# Altium integrated library LEMO Unipole And Multipole Type Connectors.IntLib: 1566 symbols (part 6 of 13) (continued)
## EXG.1B.308.HLN
designator J?
Elbow receptacle for printed circuit with two nuts (solder or screw fixing, back panel mounting), Key (G), 1B series, Multipole Type with 8 Contacts; Manufacturer: LEMO; PartNumber: EXG.1B.308.HLN; Number of contacts: 8; Contact Diameter: 0.7 mm; AWG: 24; Rated Current(A): 2; DatasheetVersion: Jun-14; PackageReference: EXG.1B.308.HLN; PackageDescription: Elbow receptacle for printed circuit with two nuts (solder or screw fixing, back panel mounting), Key(G) for Printed Circuit; Supplier 1: Mouser; Supplier Part Number 1: 736-EXG1B308HLN; Supplier 2: Digi-Key; Supplier Part Number 2: 1124-1373-ND; ComponentLink1Description: Manufacturer URL; ComponentLink1URL: http://www.lemo.com; ComponentLink2Description: Datasheet; ComponentLink2URL: http://intra.lemo.ch/catalog/ROW/UK_English/unipole_multipole.pdf
footprint EXG.1B.308.HLN (Socket, Female, Body 11mm dia. Height 14 mm, Through hole)
pins: 1, 2, 3, 4, 5, 6, 7, 8, 10, 11, 12, 13

## EXG.1B.308.HLNS
designator J?
Elbow receptacle for printed circuit with two nuts (solder or screw fixing, back panel mounting), Key (G), 1B series, Multipole Type with 8 Contacts; Manufacturer: LEMO; PartNumber: EXG.1B.308.HLNS; Number of contacts: 8; Contact Diameter: 0.7 mm; AWG: 24; Rated Current(A): 2; DatasheetVersion: Jun-14; PackageReference: EXG.1B.308.HLNS; PackageDescription: Elbow receptacle for printed circuit with two nuts (solder or screw fixing, back panel mounting), Key(G) for Printed Circuit; Supplier 1: Mouser; Supplier Part Number 1: 736-EXG1B308HLNS; Supplier 2: Digi-Key; Supplier Part Number 2: EXG.1B.308.HLNS-ND; ComponentLink1Description: Manufacturer URL; ComponentLink1URL: http://www.lemo.com; ComponentLink2Description: Datasheet; ComponentLink2URL: http://intra.lemo.ch/catalog/ROW/UK_English/unipole_multipole.pdf
footprint EXG.1B.308.HLNS (Socket, Female, Body 11mm dia. Height 14 mm, Through hole)
pins: 1, 2, 3, 4, 5, 6, 7, 8, 10, 11, 12, 13

## EXG.1B.310.HLN
designator J?
Elbow receptacle for printed circuit with two nuts (solder or screw fixing, back panel mounting), Key (G), 1B series, Multipole Type with 10 Contacts; Manufacturer: LEMO; PartNumber: EXG.1B.310.HLN; Number of contacts: 10; Contact Diameter: 0.5 mm; AWG: 28; Rated Current(A): 1.5.; DatasheetVersion: Jun-14; PackageReference: EXG.1B.310.HLN; PackageDescription: Elbow receptacle for printed circuit with two nuts (solder or screw fixing, back panel mounting), Key(G) for Printed Circuit; Supplier 1: Mouser; Supplier Part Number 1: 736-EXG1B310HLN; Supplier 2: Digi-Key; Supplier Part Number 2: EXG.1B.310.HLN-ND; ComponentLink1Description: Manufacturer URL; ComponentLink1URL: http://www.lemo.com; ComponentLink2Description: Datasheet; ComponentLink2URL: http://intra.lemo.ch/catalog/ROW/UK_English/unipole_multipole.pdf
footprint EXG.1B.310.HLN (Socket, Female, Body 11mm dia. Height 14 mm, Through hole)
pins: 1, 2, 3, 4, 5, 6, 7, 8, 9, 10, 12, 13, 14, 15

## EXG.1B.310.HLNS
designator J?
Elbow receptacle for printed circuit with two nuts (solder or screw fixing, back panel mounting), Key (G), 1B series, Multipole Type with 10 Contacts; Manufacturer: LEMO; PartNumber: EXG.1B.310.HLNS; Number of contacts: 10; Contact Diameter: 0.5 mm; AWG: 28; Rated Current(A): 1.5.; DatasheetVersion: Jun-14; PackageReference: EXG.1B.310.HLNS; PackageDescription: Elbow receptacle for printed circuit with two nuts (solder or screw fixing, back panel mounting), Key(G) for Printed Circuit; Supplier 1: Mouser; Supplier Part Number 1: 736-EXG1B310HLNS; Supplier 2: Digi-Key; Supplier Part Number 2: EXG.1B.310.HLNS-ND; ComponentLink1Description: Manufacturer URL; ComponentLink1URL: http://www.lemo.com; ComponentLink2Description: Datasheet; ComponentLink2URL: http://intra.lemo.ch/catalog/ROW/UK_English/unipole_multipole.pdf
footprint EXG.1B.310.HLNS (Socket, Female, Body 11mm dia. Height 14 mm, Through hole)
pins: 1, 2, 3, 4, 5, 6, 7, 8, 9, 10, 12, 13, 14, 15

## EYA.0B.307.CLN
designator J?
Fixed receptacle for printed circuit, nut fixing (back panel mounting), Key (A), 0B series, Multipole Type with 7 Contacts; Manufacturer: LEMO; PartNumber: EYA.0B.307.CLN; Number of contacts: 7; Contact Diameter: 0.5 mm; AWG: 28; Rated Current(A): 2.5; DatasheetVersion: Jun-14; PackageReference: EYA.0B.307.CLN; PackageDescription: Fixed receptacle for printed circuit, nut fixing (back panel mounting), Key(A) for Printed Circuit; Supplier 1: Mouser; Supplier Part Number 1: 736-EYA.0B.307.CLN; Supplier 2: Digi-Key; Supplier Part Number 2: EYA.0B.307.CLN-ND; ComponentLink1Description: Manufacturer URL; ComponentLink1URL: http://www.lemo.com; ComponentLink2Description: Datasheet; ComponentLink2URL: http://intra.lemo.ch/catalog/ROW/UK_English/unipole_multipole.pdf
footprint EYA.0B.307.CLN (Socket, Female, Body 9mm dia. Height 15 mm, Through hole)
pins: 1, 2, 3, 4, 5, 6, 7, 9, 10, 11, 12

## EYA.0B.309.CLN
designator J?
Fixed receptacle for printed circuit, nut fixing (back panel mounting), Key (A), 0B series, Multipole Type with 9 Contacts; Manufacturer: LEMO; PartNumber: EYA.0B.309.CLN; Number of contacts: 9; Contact Diameter: 0.5 mm; AWG: 28; Rated Current(A): 2; DatasheetVersion: Jun-14; PackageReference: EYA.0B.309.CLN; PackageDescription: Fixed receptacle for printed circuit, nut fixing (back panel mounting), Key(A) for Printed Circuit; ComponentLink1Description: Manufacturer URL; ComponentLink1URL: http://www.lemo.com; ComponentLink2Description: Datasheet; ComponentLink2URL: http://intra.lemo.ch/catalog/ROW/UK_English/unipole_multipole.pdf
footprint EYA.0B.309.CLN (Socket, Female, Body 9mm dia. Height 15 mm, Through hole)
pins: 1, 2, 3, 4, 5, 6, 7, 8, 9, 11, 12, 13, 14

## EYB.0B.305.CLN
designator J?
Fixed receptacle for printed circuit, nut fixing (back panel mounting), Key (B), 0B series, Multipole Type with 5 Contacts; Manufacturer: LEMO; PartNumber: EYB.0B.305.CLN; Number of contacts: 5; Contact Diameter: 0.7 mm; AWG: 24; Rated Current(A): 6.5; DatasheetVersion: Jun-14; PackageReference: EYB.0B.305.CLN; PackageDescription: Fixed receptacle for printed circuit, nut fixing (back panel mounting), Key(B) for Printed Circuit; ComponentLink1Description: Manufacturer URL; ComponentLink1URL: http://www.lemo.com; ComponentLink2Description: Datasheet; ComponentLink2URL: http://intra.lemo.ch/catalog/ROW/UK_English/unipole_multipole.pdf
footprint EYB.0B.305.CLN (Socket, Female, Body 9mm dia. Height 15 mm, Through hole)
pins: 1, 2, 3, 4, 5, 7, 8, 9, 10

## EYB.0B.309.CLN
designator J?
Fixed receptacle for printed circuit, nut fixing (back panel mounting), Key (B), 0B series, Multipole Type with 9 Contacts; Manufacturer: LEMO; PartNumber: EYB.0B.309.CLN; Number of contacts: 9; Contact Diameter: 0.5 mm; AWG: 28; Rated Current(A): 2; DatasheetVersion: Jun-14; PackageReference: EYB.0B.309.CLN; PackageDescription: Fixed receptacle for printed circuit, nut fixing (back panel mounting), Key(B) for Printed Circuit; ComponentLink1Description: Manufacturer URL; ComponentLink1URL: http://www.lemo.com; ComponentLink2Description: Datasheet; ComponentLink2URL: http://intra.lemo.ch/catalog/ROW/UK_English/unipole_multipole.pdf
footprint EYB.0B.309.CLN (Socket, Female, Body 9mm dia. Height 15 mm, Through hole)
pins: 1, 2, 3, 4, 5, 6, 7, 8, 9, 11, 12, 13, 14

## EYG.0B.302.CLN
designator J?
Fixed receptacle for printed circuit, nut fixing (back panel mounting), Key (G), 0B series, Multipole Type with 2 Contacts; Manufacturer: LEMO; PartNumber: EYG.0B.302.CLN; Number of contacts: 2; Contact Diameter: 0.9 mm; AWG: 22; Rated Current(A): 10; DatasheetVersion: Jun-14; PackageReference: EYG.0B.302.CLN; PackageDescription: Fixed receptacle for printed circuit, nut fixing (back panel mounting), Key(G) for Printed Circuit; Supplier 1: Mouser; Supplier Part Number 1: 736-EYG0B302CLN; Supplier 2: Digi-Key; Supplier Part Number 2: EYG.0B.302.CLN-ND; ComponentLink1Description: Manufacturer URL; ComponentLink1URL: http://www.lemo.com; ComponentLink2Description: Datasheet; ComponentLink2URL: http://intra.lemo.ch/catalog/ROW/UK_English/unipole_multipole.pdf
footprint EYG.0B.302.CLN (Socket, Female, Body 9mm dia. Height 15 mm, Through hole)
pins: 1, 2, 4, 5, 6, 7

## EYG.0B.303.CLN
designator J?
Fixed receptacle for printed circuit, nut fixing (back panel mounting), Key (G), 0B series, Multipole Type with 3 Contacts; Manufacturer: LEMO; PartNumber: EYG.0B.303.CLN; Number of contacts: 3; Contact Diameter: 0.9 mm; AWG: 22; Rated Current(A): 8; DatasheetVersion: Jun-14; PackageReference: EYG.0B.303.CLN; PackageDescription: Fixed receptacle for printed circuit, nut fixing (back panel mounting), Key(G) for Printed Circuit; Supplier 1: Mouser; Supplier Part Number 1: 736-EYG0B303CLN; Supplier 2: Digi-Key; Supplier Part Number 2: EYG.0B.303.CLN-ND; ComponentLink1Description: Manufacturer URL; ComponentLink1URL: http://www.lemo.com; ComponentLink2Description: Datasheet; ComponentLink2URL: http://intra.lemo.ch/catalog/ROW/UK_English/unipole_multipole.pdf
footprint EYG.0B.303.CLN (Socket, Female, Body 9mm dia. Height 15 mm, Through hole)
pins: 1, 2, 3, 5, 6, 7, 8

## EYG.0B.304.CLN
designator J?
Fixed receptacle for printed circuit, nut fixing (back panel mounting), Key (G), 0B series, Multipole Type with 4 Contacts; Manufacturer: LEMO; PartNumber: EYG.0B.304.CLN; Number of contacts: 4; Contact Diameter: 0.7 mm; AWG: 24; Rated Current(A): 7; DatasheetVersion: Jun-14; PackageReference: EYG.0B.304.CLN; PackageDescription: Fixed receptacle for printed circuit, nut fixing (back panel mounting), Key(G) for Printed Circuit; Supplier 1: Mouser; Supplier Part Number 1: 736-EYG0B304CLN; Supplier 2: Digi-Key; Supplier Part Number 2: EYG.0B.304.CLN-ND; ComponentLink1Description: Manufacturer URL; ComponentLink1URL: http://www.lemo.com; ComponentLink2Description: Datasheet; ComponentLink2URL: http://intra.lemo.ch/catalog/ROW/UK_English/unipole_multipole.pdf
footprint EYG.0B.304.CLN (Socket, Female, Body 9mm dia. Height 15 mm, Through hole)
pins: 1, 2, 3, 4, 6, 7, 8, 9

## EYG.0B.305.CLN
designator J?
Fixed receptacle for printed circuit, nut fixing (back panel mounting), Key (G), 0B series, Multipole Type with 5 Contacts; Manufacturer: LEMO; PartNumber: EYG.0B.305.CLN; Number of contacts: 5; Contact Diameter: 0.7 mm; AWG: 24; Rated Current(A): 6.5; DatasheetVersion: Jun-14; PackageReference: EYG.0B.305.CLN; PackageDescription: Fixed receptacle for printed circuit, nut fixing (back panel mounting), Key(G) for Printed Circuit; Supplier 1: Mouser; Supplier Part Number 1: 736-EYG0B305CLN; Supplier 2: Digi-Key; Supplier Part Number 2: EYG.0B.305.CLN-ND; ComponentLink1Description: Manufacturer URL; ComponentLink1URL: http://www.lemo.com; ComponentLink2Description: Datasheet; ComponentLink2URL: http://intra.lemo.ch/catalog/ROW/UK_English/unipole_multipole.pdf
footprint EYG.0B.305.CLN (Socket, Female, Body 9mm dia. Height 15 mm, Through hole)
pins: 1, 2, 3, 4, 5, 7, 8, 9, 10

## EYG.0B.306.CLN
designator J?
Fixed receptacle for printed circuit, nut fixing (back panel mounting), Key (G), 0B series, Multipole Type with 6 Contacts; Manufacturer: LEMO; PartNumber: EYG.0B.306.CLN; Number of contacts: 6; Contact Diameter: 0.5 mm; AWG: 28; Rated Current(A): 2.5; DatasheetVersion: Jun-14; PackageReference: EYG.0B.306.CLN; PackageDescription: Fixed receptacle for printed circuit, nut fixing (back panel mounting), Key(G) for Printed Circuit; Supplier 1: Mouser; Supplier Part Number 1: 736-EYG0B306CLN; Supplier 2: Digi-Key; Supplier Part Number 2: EYG.0B.306.CLN-ND; ComponentLink1Description: Manufacturer URL; ComponentLink1URL: http://www.lemo.com; ComponentLink2Description: Datasheet; ComponentLink2URL: http://intra.lemo.ch/catalog/ROW/UK_English/unipole_multipole.pdf
footprint EYG.0B.306.CLN (Socket, Female, Body 9mm dia. Height 15 mm, Through hole)
pins: 1, 2, 3, 4, 5, 6, 8, 9, 10, 11

## EYG.0B.307.CLN
designator J?
Fixed receptacle for printed circuit, nut fixing (back panel mounting), Key (G), 0B series, Multipole Type with 7 Contacts; Manufacturer: LEMO; PartNumber: EYG.0B.307.CLN; Number of contacts: 7; Contact Diameter: 0.5 mm; AWG: 28; Rated Current(A): 2.5; DatasheetVersion: Jun-14; PackageReference: EYG.0B.307.CLN; PackageDescription: Fixed receptacle for printed circuit, nut fixing (back panel mounting), Key(G) for Printed Circuit; Supplier 1: Mouser; Supplier Part Number 1: 736-EYG0B307CLN; Supplier 2: Digi-Key; Supplier Part Number 2: EYG.0B.307.CLN-ND; ComponentLink1Description: Manufacturer URL; ComponentLink1URL: http://www.lemo.com; ComponentLink2Description: Datasheet; ComponentLink2URL: http://intra.lemo.ch/catalog/ROW/UK_English/unipole_multipole.pdf
footprint EYG.0B.307.CLN (Socket, Female, Body 9mm dia. Height 15 mm, Through hole)
pins: 1, 2, 3, 4, 5, 6, 7, 9, 10, 11, 12

## EYG.0B.309.CLN
designator J?
Fixed receptacle for printed circuit, nut fixing (back panel mounting), Key (G), 0B series, Multipole Type with 9 Contacts; Manufacturer: LEMO; PartNumber: EYG.0B.309.CLN; Number of contacts: 9; Contact Diameter: 0.5 mm; AWG: 28; Rated Current(A): 2; DatasheetVersion: Jun-14; PackageReference: EYG.0B.309.CLN; PackageDescription: Fixed receptacle for printed circuit, nut fixing (back panel mounting), Key(G) for Printed Circuit; Supplier 1: Mouser; Supplier Part Number 1: 736-EYG0B309CLN; Supplier 2: Digi-Key; Supplier Part Number 2: EYG.0B.309.CLN-ND; ComponentLink1Description: Manufacturer URL; ComponentLink1URL: http://www.lemo.com; ComponentLink2Description: Datasheet; ComponentLink2URL: http://intra.lemo.ch/catalog/ROW/UK_English/unipole_multipole.pdf
footprint EYG.0B.309.CLN (Socket, Female, Body 9mm dia. Height 15 mm, Through hole)
pins: 1, 2, 3, 4, 5, 6, 7, 8, 9, 11, 12, 13, 14

## EZA.0B.302.CLN
designator J?
Straight receptacle for printed circuit, Key (A), 0B series, Multipole Type with 2 Contacts; Manufacturer: LEMO; PartNumber: EZA.0B.302.CLN; Number of contacts: 2; Contact Diameter: 0.9 mm; AWG: 22; Rated Current(A): 10; DatasheetVersion: Jun-14; PackageReference: EZA.0B.302.CLN; PackageDescription: Straight receptacle for printed circuit, Key(A) for Printed Circuit; Supplier 1: Mouser; Supplier Part Number 1: N/A; ComponentLink1Description: Manufacturer URL; ComponentLink1URL: http://www.lemo.com; ComponentLink2Description: Datasheet; ComponentLink2URL: http://intra.lemo.ch/catalog/ROW/UK_English/unipole_multipole.pdf
footprint EZA.0B.302.CLN (Socket, Female, Height 15 mm, Through hole)
pins: 1, 2, 4, 5, 6, 7

## EZA.0B.303.CLN
designator J?
Straight receptacle for printed circuit, Key (A), 0B series, Multipole Type with 3 Contacts; Manufacturer: LEMO; PartNumber: EZA.0B.303.CLN; Number of contacts: 3; Contact Diameter: 0.9 mm; AWG: 22; Rated Current(A): 8; DatasheetVersion: Jun-14; PackageReference: EZA.0B.303.CLN; PackageDescription: Straight receptacle for printed circuit, Key(A) for Printed Circuit; ComponentLink1Description: Manufacturer URL; ComponentLink1URL: http://www.lemo.com; ComponentLink2Description: Datasheet; ComponentLink2URL: http://intra.lemo.ch/catalog/ROW/UK_English/unipole_multipole.pdf
footprint EZA.0B.303.CLN (Socket, Female, Height 15 mm, Through hole)
pins: 1, 2, 3, 5, 6, 7, 8

## EZA.0B.309.CLN
designator J?
Straight receptacle for printed circuit, Key (A), 0B series, Multipole Type with 9 Contacts; Manufacturer: LEMO; PartNumber: EZA.0B.309.CLN; Number of contacts: 9; Contact Diameter: 0.5 mm; AWG: 28; Rated Current(A): 2; DatasheetVersion: Jun-14; PackageReference: EZA.0B.309.CLN; PackageDescription: Straight receptacle for printed circuit, Key(A) for Printed Circuit; ComponentLink1Description: Manufacturer URL; ComponentLink1URL: http://www.lemo.com; ComponentLink2Description: Datasheet; ComponentLink2URL: http://intra.lemo.ch/catalog/ROW/UK_English/unipole_multipole.pdf
footprint EZA.0B.309.CLN (Socket, Female, Height 15 mm, Through hole)
pins: 1, 2, 3, 4, 5, 6, 7, 8, 9, 11, 12, 13, 14

## EZB.0B.303.CLN
designator J?
Straight receptacle for printed circuit, Key (B), 0B series, Multipole Type with 3 Contacts; Manufacturer: LEMO; PartNumber: EZB.0B.303.CLN; Number of contacts: 3; Contact Diameter: 0.9 mm; AWG: 22; Rated Current(A): 8; DatasheetVersion: Jun-14; PackageReference: EZB.0B.303.CLN; PackageDescription: Straight receptacle for printed circuit, Key(B) for Printed Circuit; ComponentLink1Description: Manufacturer URL; ComponentLink1URL: http://www.lemo.com; ComponentLink2Description: Datasheet; ComponentLink2URL: http://intra.lemo.ch/catalog/ROW/UK_English/unipole_multipole.pdf
footprint EZB.0B.303.CLN (Socket, Female, Height 15 mm, Through hole)
pins: 1, 2, 3, 5, 6, 7, 8

## EZB.0B.305.CLN
designator J?
Straight receptacle for printed circuit, Key (B), 0B series, Multipole Type with 5 Contacts; Manufacturer: LEMO; PartNumber: EZB.0B.305.CLN; Number of contacts: 5; Contact Diameter: 0.7 mm; AWG: 24; Rated Current(A): 6.5; DatasheetVersion: Jun-14; PackageReference: EZB.0B.305.CLN; PackageDescription: Straight receptacle for printed circuit, Key(B) for Printed Circuit; Supplier 1: Mouser; Supplier Part Number 1: 736-EZB0B305CLN; Supplier 2: Digi-Key; Supplier Part Number 2: EZB.0B.305.CLN-ND; ComponentLink1Description: Manufacturer URL; ComponentLink1URL: http://www.lemo.com; ComponentLink2Description: Datasheet; ComponentLink2URL: http://intra.lemo.ch/catalog/ROW/UK_English/unipole_multipole.pdf
footprint EZB.0B.305.CLN (Socket, Female, Height 15 mm, Through hole)
pins: 1, 2, 3, 4, 5, 7, 8, 9, 10

## EZB.0B.307.CLN
designator J?
Straight receptacle for printed circuit, Key (B), 0B series, Multipole Type with 7 Contacts; Manufacturer: LEMO; PartNumber: EZB.0B.307.CLN; Number of contacts: 7; Contact Diameter: 0.5 mm; AWG: 28; Rated Current(A): 2.5; DatasheetVersion: Jun-14; PackageReference: EZB.0B.307.CLN; PackageDescription: Straight receptacle for printed circuit, Key(B) for Printed Circuit; ComponentLink1Description: Manufacturer URL; ComponentLink1URL: http://www.lemo.com; ComponentLink2Description: Datasheet; ComponentLink2URL: http://intra.lemo.ch/catalog/ROW/UK_English/unipole_multipole.pdf
footprint EZB.0B.307.CLN (Socket, Female, Height 15 mm, Through hole)
pins: 1, 2, 3, 4, 5, 6, 7, 9, 10, 11, 12

## EZF.0B.304.CLN
designator J?
Straight receptacle for printed circuit, Key (F), 0B series, Multipole Type with 4 Contacts; Manufacturer: LEMO; PartNumber: EZF.0B.304.CLN; Number of contacts: 4; Contact Diameter: 0.7 mm; AWG: 24; Rated Current(A): 7; DatasheetVersion: Jun-14; PackageReference: EZF.0B.304.CLN; PackageDescription: Straight receptacle for printed circuit, Key(F) for Printed Circuit; Supplier 1: Mouser; Supplier Part Number 1: 736-EZF0B304CLN; Supplier 2: Digi-Key; Supplier Part Number 2: EZF.0B.304.CLN-ND; ComponentLink1Description: Manufacturer URL; ComponentLink1URL: http://www.lemo.com; ComponentLink2Description: Datasheet; ComponentLink2URL: http://intra.lemo.ch/catalog/ROW/UK_English/unipole_multipole.pdf
footprint EZF.0B.304.CLN (Socket, Female, Height 15 mm, Through hole)
pins: 1, 2, 3, 4, 6, 7, 8, 9

## EZG.00.302.NLN
designator J?
Straight receptacle for printed circuit, Key (G), 00 series, Multipole Type with 2 Contacts; Manufacturer: LEMO; PartNumber: EZG.00.302.NLN; Number of contacts: 2; Contact Diameter: 0.5 mm; AWG: 28; Rated Current(A): 5; DatasheetVersion: Jun-14; PackageReference: EZG.00.302.NLN; PackageDescription: Straight receptacle for printed circuit, Key(G) for Printed Circuit; Supplier 1: Mouser; Supplier Part Number 1: 736-EZG00302NLN; Supplier 2: Digi-Key; Supplier Part Number 2: EZG.00.302.NLN-ND; ComponentLink1Description: Manufacturer URL; ComponentLink1URL: http://www.lemo.com; ComponentLink2Description: Datasheet; ComponentLink2URL: http://intra.lemo.ch/catalog/ROW/UK_English/unipole_multipole.pdf
footprint EZG.00.302.NLN (Socket, Female, Height 14 mm, Through hole)
pins: 1, 2, 4, 5, 6, 7

## EZG.0B.302.CLN
designator J?
Straight receptacle for printed circuit, Key (G), 0B series, Multipole Type with 2 Contacts; Manufacturer: LEMO; PartNumber: EZG.0B.302.CLN; Number of contacts: 2; Contact Diameter: 0.9 mm; AWG: 22; Rated Current(A): 10; DatasheetVersion: Jun-14; PackageReference: EZG.0B.302.CLN; PackageDescription: Straight receptacle for printed circuit, Key(G) for Printed Circuit; Supplier 1: Mouser; Supplier Part Number 1: 736-EZG0B302CLN; Supplier 2: Digi-Key; Supplier Part Number 2: 1124-1374-ND; ComponentLink1Description: Manufacturer URL; ComponentLink1URL: http://www.lemo.com; ComponentLink2Description: Datasheet; ComponentLink2URL: http://intra.lemo.ch/catalog/ROW/UK_English/unipole_multipole.pdf
footprint EZG.0B.302.CLN (Socket, Female, Height 15 mm, Through hole)
pins: 1, 2, 4, 5, 6, 7

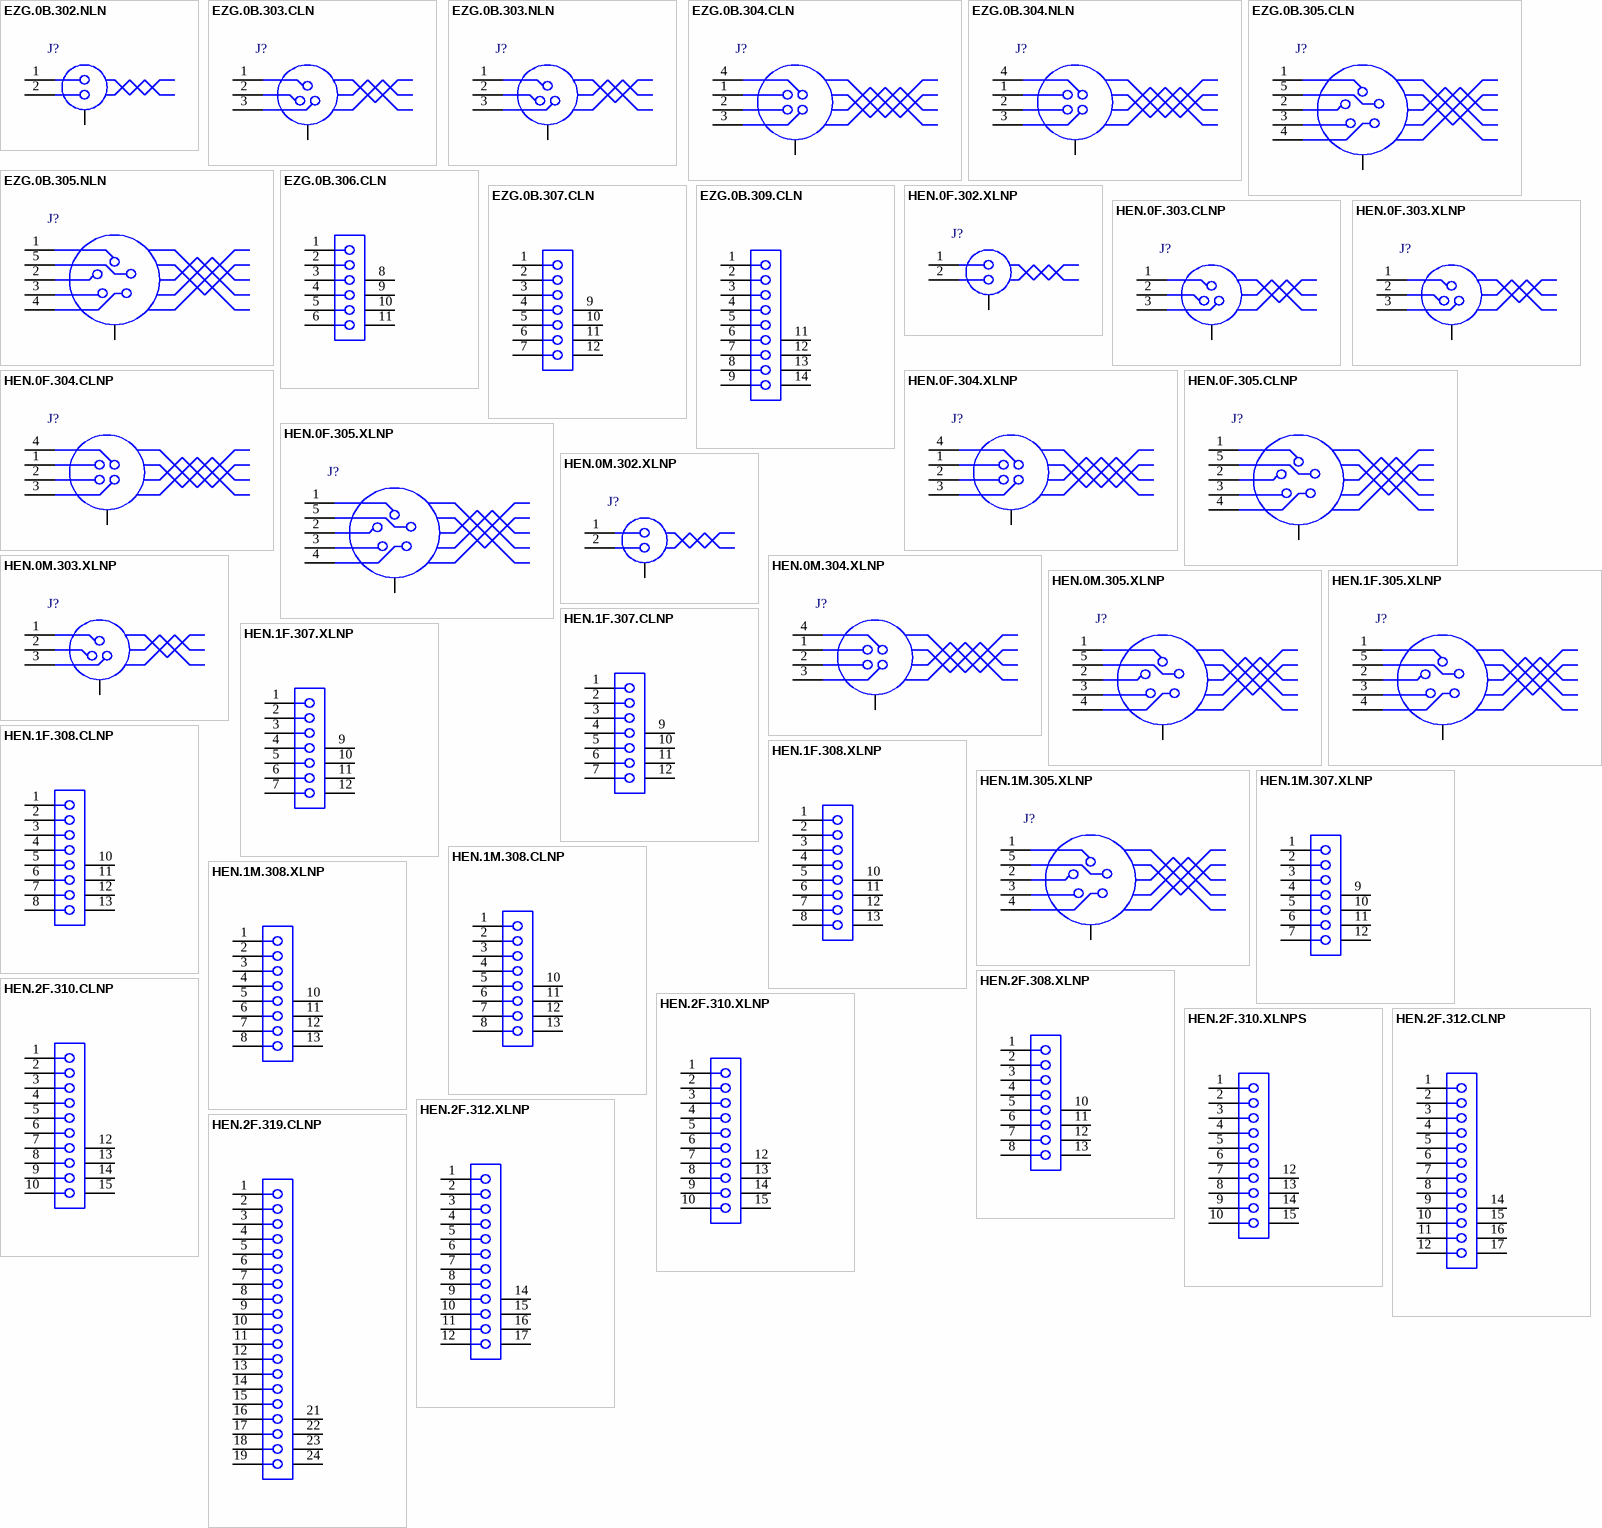
[diagram p18: symbols EZG.0B.302.NLN to HEN.2F.319.CLNP]

## EZG.0B.302.NLN
designator J?
Straight receptacle for printed circuit, Key (G), 0B series, Multipole Type with 2 Contacts; Manufacturer: LEMO; PartNumber: EZG.0B.302.NLN; Number of contacts: 2; Contact Diameter: 0.9 mm; AWG: 22; Rated Current(A): 10; DatasheetVersion: Jun-14; PackageReference: EZG.0B.302.NLN; PackageDescription: Straight receptacle for printed circuit, Key(G) for Printed Circuit; Supplier 1: Mouser; Supplier Part Number 1: 736-EZG0B302NLN; Supplier 2: Digi-Key; Supplier Part Number 2: EZG.0B.302.NLN-ND; ComponentLink1Description: Manufacturer URL; ComponentLink1URL: http://www.lemo.com; ComponentLink2Description: Datasheet; ComponentLink2URL: http://intra.lemo.ch/catalog/ROW/UK_English/unipole_multipole.pdf
footprint EZG.0B.302.NLN (Socket, Female, Height 15 mm, Through hole)
pins: 1, 2, 4, 5, 6, 7

## EZG.0B.303.CLN
designator J?
Straight receptacle for printed circuit, Key (G), 0B series, Multipole Type with 3 Contacts; Manufacturer: LEMO; PartNumber: EZG.0B.303.CLN; Number of contacts: 3; Contact Diameter: 0.9 mm; AWG: 22; Rated Current(A): 8; DatasheetVersion: Jun-14; PackageReference: EZG.0B.303.CLN; PackageDescription: Straight receptacle for printed circuit, Key(G) for Printed Circuit; Supplier 1: Mouser; Supplier Part Number 1: 736-EZG0B303CLN; Supplier 2: Digi-Key; Supplier Part Number 2: EZG.0B.303.CLN-ND; ComponentLink1Description: Manufacturer URL; ComponentLink1URL: http://www.lemo.com; ComponentLink2Description: Datasheet; ComponentLink2URL: http://intra.lemo.ch/catalog/ROW/UK_English/unipole_multipole.pdf
footprint EZG.0B.303.CLN (Socket, Female, Height 15 mm, Through hole)
pins: 1, 2, 3, 5, 6, 7, 8

## EZG.0B.303.NLN
designator J?
Straight receptacle for printed circuit, Key (G), 0B series, Multipole Type with 3 Contacts; Manufacturer: LEMO; PartNumber: EZG.0B.303.NLN; Number of contacts: 3; Contact Diameter: 0.9 mm; AWG: 22; Rated Current(A): 8; DatasheetVersion: Jun-14; PackageReference: EZG.0B.303.NLN; PackageDescription: Straight receptacle for printed circuit, Key(G) for Printed Circuit; ComponentLink1Description: Manufacturer URL; ComponentLink1URL: http://www.lemo.com; ComponentLink2Description: Datasheet; ComponentLink2URL: http://intra.lemo.ch/catalog/ROW/UK_English/unipole_multipole.pdf
footprint EZG.0B.303.NLN (Socket, Female, Height 15 mm, Through hole)
pins: 1, 2, 3, 5, 6, 7, 8

## EZG.0B.304.CLN
designator J?
Straight receptacle for printed circuit, Key (G), 0B series, Multipole Type with 4 Contacts; Manufacturer: LEMO; PartNumber: EZG.0B.304.CLN; Number of contacts: 4; Contact Diameter: 0.7 mm; AWG: 24; Rated Current(A): 7; DatasheetVersion: Jun-14; PackageReference: EZG.0B.304.CLN; PackageDescription: Straight receptacle for printed circuit, Key(G) for Printed Circuit; Supplier 1: Mouser; Supplier Part Number 1: 736-EZG0B304CLN; Supplier 2: Digi-Key; Supplier Part Number 2: EZG.0B.304.CLN-ND; ComponentLink1Description: Manufacturer URL; ComponentLink1URL: http://www.lemo.com; ComponentLink2Description: Datasheet; ComponentLink2URL: http://intra.lemo.ch/catalog/ROW/UK_English/unipole_multipole.pdf
footprint EZG.0B.304.CLN (Socket, Female, Height 15 mm, Through hole)
pins: 1, 2, 3, 4, 6, 7, 8, 9

## EZG.0B.304.NLN
designator J?
Straight receptacle for printed circuit, Key (G), 0B series, Multipole Type with 4 Contacts; Manufacturer: LEMO; PartNumber: EZG.0B.304.NLN; Number of contacts: 4; Contact Diameter: 0.7 mm; AWG: 24; Rated Current(A): 7; DatasheetVersion: Jun-14; PackageReference: EZG.0B.304.NLN; PackageDescription: Straight receptacle for printed circuit, Key(G) for Printed Circuit; Supplier 1: Mouser; Supplier Part Number 1: 736-EZG0B304NLN; Supplier 2: Digi-Key; Supplier Part Number 2: EZG.0B.304.NLN-ND; ComponentLink1Description: Manufacturer URL; ComponentLink1URL: http://www.lemo.com; ComponentLink2Description: Datasheet; ComponentLink2URL: http://intra.lemo.ch/catalog/ROW/UK_English/unipole_multipole.pdf
footprint EZG.0B.304.NLN (Socket, Female, Height 15 mm, Through hole)
pins: 1, 2, 3, 4, 6, 7, 8, 9

## EZG.0B.305.CLN
designator J?
Straight receptacle for printed circuit, Key (G), 0B series, Multipole Type with 5 Contacts; Manufacturer: LEMO; PartNumber: EZG.0B.305.CLN; Number of contacts: 5; Contact Diameter: 0.7 mm; AWG: 24; Rated Current(A): 6.5; DatasheetVersion: Jun-14; PackageReference: EZG.0B.305.CLN; PackageDescription: Straight receptacle for printed circuit, Key(G) for Printed Circuit; Supplier 1: Mouser; Supplier Part Number 1: 736-EZG0B305CLN; Supplier 2: Digi-Key; Supplier Part Number 2: EZG.0B.305.CLN-ND; ComponentLink1Description: Manufacturer URL; ComponentLink1URL: http://www.lemo.com; ComponentLink2Description: Datasheet; ComponentLink2URL: http://intra.lemo.ch/catalog/ROW/UK_English/unipole_multipole.pdf
footprint EZG.0B.305.CLN (Socket, Female, Height 15 mm, Through hole)
pins: 1, 2, 3, 4, 5, 7, 8, 9, 10

## EZG.0B.305.NLN
designator J?
Straight receptacle for printed circuit, Key (G), 0B series, Multipole Type with 5 Contacts; Manufacturer: LEMO; PartNumber: EZG.0B.305.NLN; Number of contacts: 5; Contact Diameter: 0.7 mm; AWG: 24; Rated Current(A): 6.5; DatasheetVersion: Jun-14; PackageReference: EZG.0B.305.NLN; PackageDescription: Straight receptacle for printed circuit, Key(G) for Printed Circuit; ComponentLink1Description: Manufacturer URL; ComponentLink1URL: http://www.lemo.com; ComponentLink2Description: Datasheet; ComponentLink2URL: http://intra.lemo.ch/catalog/ROW/UK_English/unipole_multipole.pdf
footprint EZG.0B.305.NLN (Socket, Female, Height 15 mm, Through hole)
pins: 1, 2, 3, 4, 5, 7, 8, 9, 10

## EZG.0B.306.CLN
designator J?
Straight receptacle for printed circuit, Key (G), 0B series, Multipole Type with 6 Contacts; Manufacturer: LEMO; PartNumber: EZG.0B.306.CLN; Number of contacts: 6; Contact Diameter: 0.5 mm; AWG: 28; Rated Current(A): 2.5; DatasheetVersion: Jun-14; PackageReference: EZG.0B.306.CLN; PackageDescription: Straight receptacle for printed circuit, Key(G) for Printed Circuit; Supplier 1: Mouser; Supplier Part Number 1: 736-EZG0B306CLN; Supplier 2: Digi-Key; Supplier Part Number 2: EZG.0B.306.CLN-ND; ComponentLink1Description: Manufacturer URL; ComponentLink1URL: http://www.lemo.com; ComponentLink2Description: Datasheet; ComponentLink2URL: http://intra.lemo.ch/catalog/ROW/UK_English/unipole_multipole.pdf
footprint EZG.0B.306.CLN (Socket, Female, Height 15 mm, Through hole)
pins: 1, 2, 3, 4, 5, 6, 8, 9, 10, 11

## EZG.0B.307.CLN
designator J?
Straight receptacle for printed circuit, Key (G), 0B series, Multipole Type with 7 Contacts; Manufacturer: LEMO; PartNumber: EZG.0B.307.CLN; Number of contacts: 7; Contact Diameter: 0.5 mm; AWG: 28; Rated Current(A): 2.5; DatasheetVersion: Jun-14; PackageReference: EZG.0B.307.CLN; PackageDescription: Straight receptacle for printed circuit, Key(G) for Printed Circuit; Supplier 1: Mouser; Supplier Part Number 1: 736-EZG0B307CLN; Supplier 2: Digi-Key; Supplier Part Number 2: EZG.0B.307.CLN-ND; ComponentLink1Description: Manufacturer URL; ComponentLink1URL: http://www.lemo.com; ComponentLink2Description: Datasheet; ComponentLink2URL: http://intra.lemo.ch/catalog/ROW/UK_English/unipole_multipole.pdf
footprint EZG.0B.307.CLN (Socket, Female, Height 15 mm, Through hole)
pins: 1, 2, 3, 4, 5, 6, 7, 9, 10, 11, 12
